# Altium footprint library MyPcbLib.PcbLib: 237 footprints (part 11 of 15)
Each footprint in its own frame and in the unit in brackets; x right, y up, seen from the top. Pads: shape width x height; smd on the part's side, far side on the other; paste and mask are expansions set on the pad; w line width, h text height; cw(c..) or ccw(c..) is an arc to the next point about the centre after c.
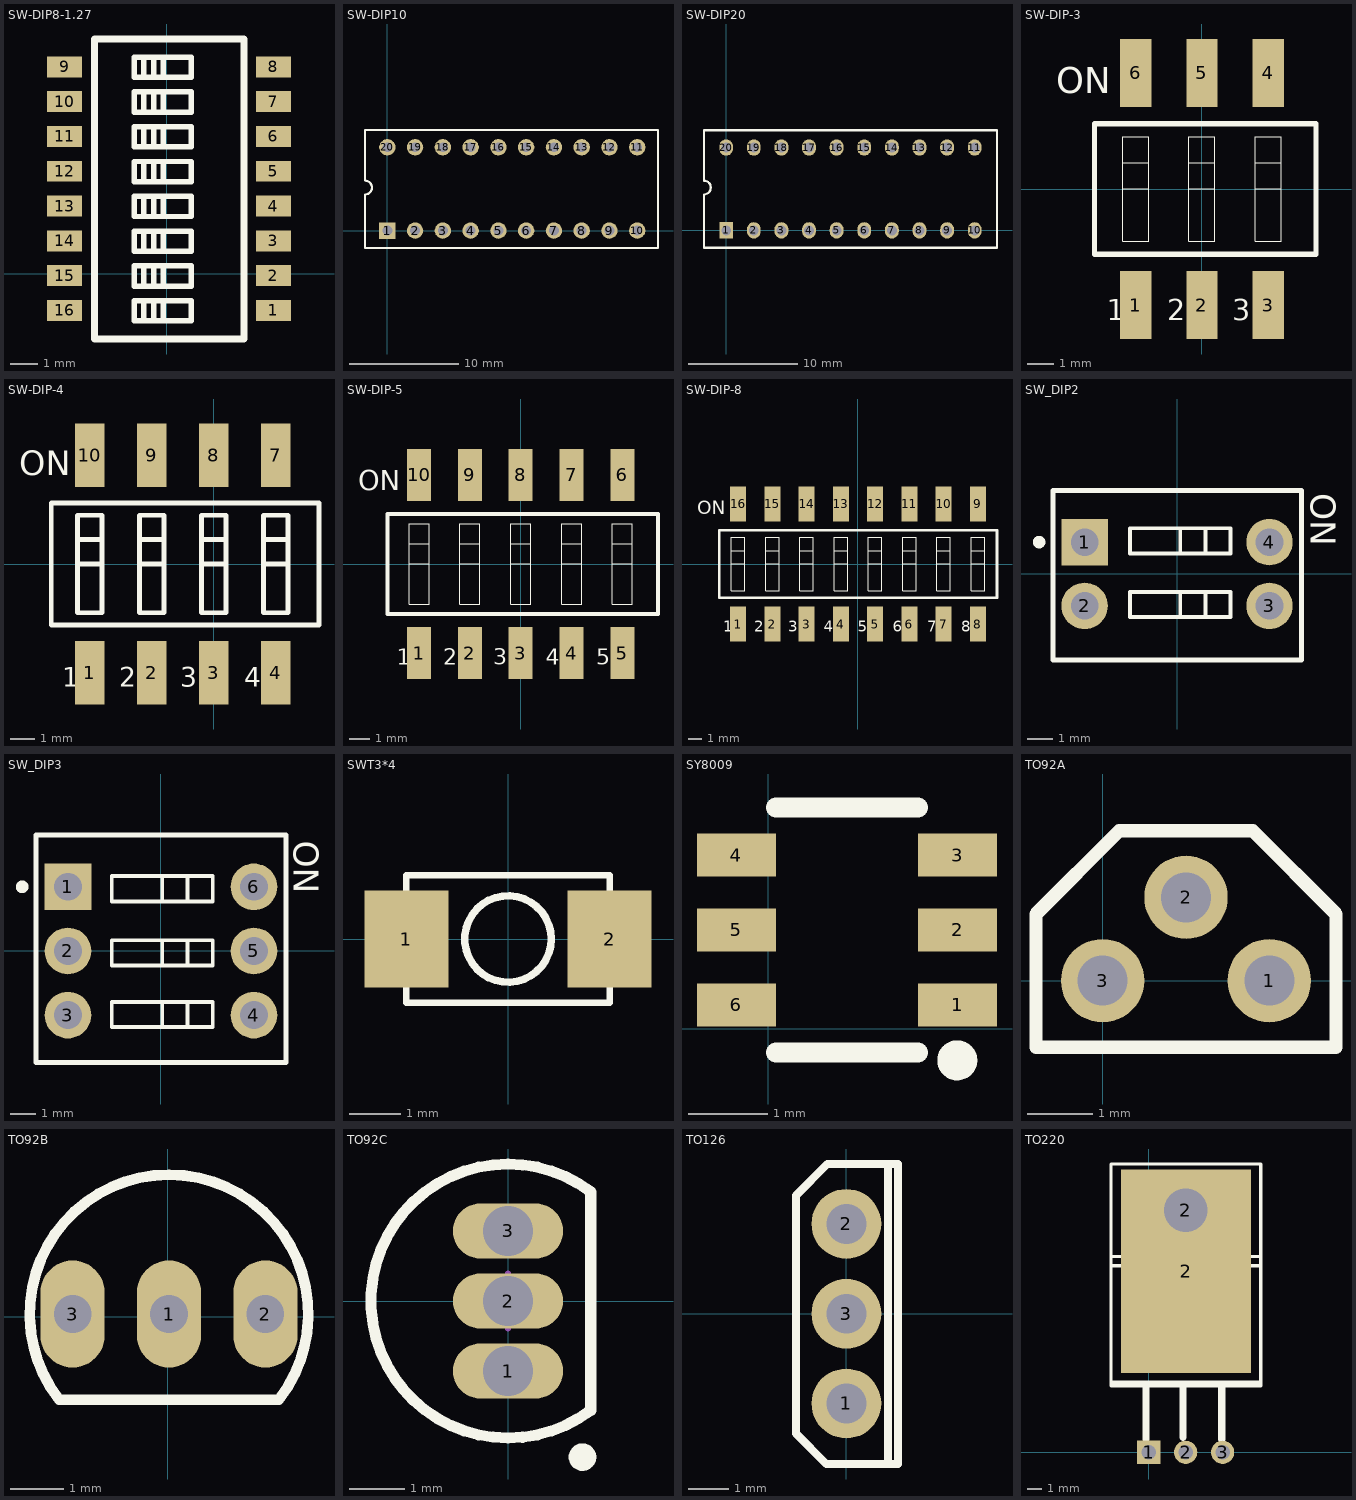
[diagram p10: the footprints below, top view; thin cyan lines are the x and y axes]

## SW-DIP8-1.27 [mil]
pads (16):
  rect 50x29.92 smd: 1(153,-53) 2(153,-3) 3(153,47) 4(153,97) 5(153,147) 6(153,197) 7(153,247) 8(153,297) 9(-147,297) 10(-147,247) 11(-147,197) 12(-147,147) 13(-147,97) 14(-147,47) 15(-147,-3) 16(-147,-53)
Top Overlay:
  lines w7.87: -33,-67 -33,-39 ; -33,-17 -33,11 ; -33,33 -33,61 ; -33,83 -33,111 ; -33,133 -33,161 ; -33,183 -33,211 ; -33,233 -33,261 ; -33,283 -33,311 ; -19,-68 -19,-42 ; -19,-18 -19,8 ; -19,32 -19,58 ; -19,82 -19,108 ; -19,132 -19,158 ; -19,182 -19,208 ; -19,232 -19,258 ; -19,282 -19,308 ; -5,-64 -5,-42 ; -5,-14 -5,8 ; -5,36 -5,58 ; -5,86 -5,108 ; -5,136 -5,158 ; -5,186 -5,208 ; -5,236 -5,258 ; -5,286 -5,308 ; -47,-68 -47,-39 35,-39 35,-68 -47,-68 ; -47,-18 -47,11 35,11 35,-18 -47,-18 ; -47,32 35,32 35,61 -47,61 -47,32 ; -47,82 -47,111 35,111 35,82 -47,82 ; -47,132 35,132 35,161 -47,161 -47,132 ; -47,182 35,182 35,211 -47,211 -47,182 ; -47,232 -47,261 35,261 35,232 -47,232 ; -47,282 35,282 35,311 -47,311 -47,282
  lines w10: -104,106 -104,337 111,337 111,106 ; -104,137 -104,-94 111,-94 111,137
3D body "User Library-Diptronics_DHN4.STEP": height 59.06, standoff 0, extent -135.67,96.79 139,345.21
3D body "User Library-Diptronics_DHN4.STEP": height 59.06, standoff 0, extent -135.67,-103.21 139,145.21

## SW-DIP10 [mm] "DIP; 16 Leads; Row Spacing 7.62 mm; Pitch 2.54 mm"
pads (20):
  rect 1.5x1.5 hole 0.9: 1(0,0)
  round 1.5 hole 0.9: 2(2.54,0) 3(5.08,0) 4(7.62,0) 5(10.16,0) 6(12.7,0) 7(15.24,0) 8(17.78,0) 9(20.32,0) 10(22.86,0) 11(22.86,7.62) 12(20.32,7.62) 13(17.78,7.62) 14(15.24,7.62) 15(12.7,7.62) 16(10.16,7.62) 17(7.62,7.62) 18(5.08,7.62) 19(2.54,7.62) 20(0,7.62)
Top Overlay:
  lines w0.2: -2.05,4.57 cw(c-2.05,3.935) -2.05,3.3 -2.05,-1.59 24.765,-1.59 24.765,9.2 -2.05,9.2 -2.05,4.6
3D body "DIPSWITCH10.STEP": height 6.9, standoff -3.2, extent -2.007,-1.295 24.753,8.865

## SW-DIP20 [mm] "DIP; 16 Leads; Row Spacing 7.62 mm; Pitch 2.54 mm"
pads (20):
  rect 1.27x1.5 hole 0.9: 1(0,0)
  oval 1.27x1.5 hole 0.9: 2(2.54,0) 3(5.08,0) 4(7.62,0) 5(10.16,0) 6(12.7,0) 7(15.24,0) 8(17.78,0) 9(20.32,0) 10(22.86,0) 11(22.86,7.62) 12(20.32,7.62) 13(17.78,7.62) 14(15.24,7.62) 15(12.7,7.62) 16(10.16,7.62) 17(7.62,7.62) 18(5.08,7.62) 19(2.54,7.62) 20(0,7.62)
Top Overlay:
  lines w0.2: -2.05,-1.59 -2.05,3.3 ccw(c-2.05,3.935) -2.05,4.57 ; -2.05,4.6 -2.05,9.2 ; 24.91,-1.59 24.91,9.2
  lines w0.203: -2.05,-1.59 24.892,-1.59 ; -2.05,9.2 24.892,9.2
3D body "User Library-DIP Switch Piano 10X.STEP": height 8.71, standoff -3.99, extent -2.086,-2.639 24.794,8.661

## SW-DIP-3 [mm] "DIP Switch; 16 Leads"
height 5.06
pads (6):
  rect 1.2x2.6 smd: 1(-2.54,-4.45) 2(0,-4.45) 3(2.54,-4.45) 4(2.54,4.45) 5(0,4.45) 6(-2.54,4.45)
Top Overlay:
  lines w0.025: -3.04,0 -2.04,0 ; -3.04,1 -2.04,1 ; -0.5,0 0.5,0 ; -0.5,1 0.5,1 ; 2.04,0 3.04,0 ; 2.04,1 3.04,1 ; -3.04,-2 -3.04,2 -2.04,2 -2.04,-2 -3.04,-2 ; -0.5,-2 -0.5,2 0.5,2 0.5,-2 -0.5,-2 ; 2.04,-2 2.04,2 3.04,2 3.04,-2 2.04,-2
  lines w0.2: -4.115,-2.5 -4.115,2.5 4.369,2.5 4.369,-2.5 -4.115,-2.5
  text "3" at 1.169,-5.032 h0.8
  text "2" at -1.331,-5.032 h0.8
  text "1" at -3.656,-5.032 h0.8
  text "ON" at -5.588,3.678 h1
3D body "DIP3.stp": height 4.4, standoff 0, extent -4.293,-4.951 4.267,4.849

## SW-DIP-4 [mm] "DIP Switch; 16 Leads"
height 5.06
pads (8):
  rect 1.2x2.6 smd: 1(-5.08,-4.45) 2(-2.54,-4.45) 3(0,-4.45) 4(2.54,-4.45) 7(2.54,4.45) 8(0,4.45) 9(-2.54,4.45) 10(-5.08,4.45)
Top Overlay:
  lines w0.2: -5.58,0 -4.58,0 ; -5.58,1 -4.58,1 ; -3.04,0 -2.04,0 ; -3.04,1 -2.04,1 ; -0.5,0 0.5,0 ; -0.5,1 0.5,1 ; 2.04,0 3.04,0 ; 2.04,1 3.04,1 ; -6.655,-2.5 4.318,-2.5 4.318,2.5 -6.655,2.5 -6.655,-2.5 ; -5.58,-2 -4.58,-2 -4.58,2 -5.58,2 -5.58,-2 ; -3.04,-2 -2.04,-2 -2.04,2 -3.04,2 -3.04,-2 ; -0.5,-2 0.5,-2 0.5,2 -0.5,2 -0.5,-2 ; 2.04,-2 3.04,-2 3.04,2 2.04,2 2.04,-2
  text "ON" at -7.976,3.632 h1
  text "1" at -6.196,-5.032 h0.8
  text "2" at -3.871,-5.032 h0.8
  text "3" at -1.371,-5.032 h0.8
  text "4" at 1.254,-5.032 h0.8
3D body "User Library-SMD DIP-4 switch.step": height -0.5, standoff -5.4, extent -6.845,-4.976 4.255,4.824

## SW-DIP-5 [mm] "DIP Switch; 16 Leads"
height 5.06
pads (10):
  rect 1.2x2.6 smd: 1(-5.08,-4.45) 2(-2.54,-4.45) 3(0,-4.45) 4(2.54,-4.45) 5(5.08,-4.45) 6(5.08,4.45) 7(2.54,4.45) 8(0,4.45) 9(-2.54,4.45) 10(-5.08,4.45)
Top Overlay:
  lines w0.025: -5.58,0 -4.58,0 ; -5.58,1 -4.58,1 ; -3.04,0 -2.04,0 ; -3.04,1 -2.04,1 ; -0.5,0 0.5,0 ; -0.5,1 0.5,1 ; 2.04,0 3.04,0 ; 2.04,1 3.04,1 ; 4.58,0 5.58,0 ; 4.58,1 5.58,1 ; -5.58,-2 -4.58,-2 -4.58,2 -5.58,2 -5.58,-2 ; -3.04,-2 -2.04,-2 -2.04,2 -3.04,2 -3.04,-2 ; -0.5,-2 0.5,-2 0.5,2 -0.5,2 -0.5,-2 ; 2.04,-2 3.04,-2 3.04,2 2.04,2 2.04,-2 ; 4.58,-2 5.58,-2 5.58,2 4.58,2 4.58,-2
  lines w0.2: -6.655,-2.5 6.858,-2.5 6.858,2.5 -6.655,2.5 -6.655,-2.5
  text "ON" at -8.128,3.678 h1
  text "1" at -6.196,-5.032 h0.8
  text "2" at -3.871,-5.032 h0.8
  text "3" at -1.371,-5.032 h0.8
  text "4" at 1.254,-5.032 h0.8
  text "5" at 3.779,-5.032 h0.8
3D body "DIP5.stp": height 4.4, standoff 0, extent -6.795,-5.105 6.845,4.695

## SW-DIP-8 [mm] "DIP Switch; 16 Leads"
height 5.06
pads (16):
  rect 1.2x2.6 smd: 1(-8.89,-4.45) 2(-6.35,-4.45) 3(-3.81,-4.45) 4(-1.27,-4.45) 5(1.27,-4.45) 6(3.81,-4.45) 7(6.35,-4.45) 8(8.89,-4.45) 9(8.89,4.45) 10(6.35,4.45) 11(3.81,4.45) 12(1.27,4.45) 13(-1.27,4.45) 14(-3.81,4.45) 15(-6.35,4.45) 16(-8.89,4.45)
Top Overlay:
  lines w0.025: -9.39,0 -8.39,0 ; -9.39,1 -8.39,1 ; -6.85,0 -5.85,0 ; -6.85,1 -5.85,1 ; -4.31,0 -3.31,0 ; -4.31,1 -3.31,1 ; -1.77,0 -0.77,0 ; -1.77,1 -0.77,1 ; 0.77,0 1.77,0 ; 0.77,1 1.77,1 ; 3.31,0 4.31,0 ; 3.31,1 4.31,1 ; 5.85,0 6.85,0 ; 5.85,1 6.85,1 ; 8.39,0 9.39,0 ; 8.39,1 9.39,1 ; -9.39,-2 -9.39,2 -8.39,2 -8.39,-2 -9.39,-2 ; -6.85,-2 -6.85,2 -5.85,2 -5.85,-2 -6.85,-2 ; -4.31,-2 -4.31,2 -3.31,2 -3.31,-2 -4.31,-2 ; -1.77,-2 -1.77,2 -0.77,2 -0.77,-2 -1.77,-2 ; 0.77,-2 0.77,2 1.77,2 1.77,-2 0.77,-2 ; 3.31,-2 3.31,2 4.31,2 4.31,-2 3.31,-2 ; 5.85,-2 5.85,2 6.85,2 6.85,-2 5.85,-2 ; 8.39,-2 8.39,2 9.39,2 9.39,-2 8.39,-2
  lines w0.2: -10.29,-2.5 -10.29,2.5 10.31,2.5 10.31,-2.5 -10.29,-2.5
  text "6" at 2.569,-5.032 h0.8
  text "5" at -0.031,-5.032 h0.8
  text "4" at -2.556,-5.032 h0.8
  text "3" at -5.181,-5.032 h0.8
  text "2" at -7.681,-5.032 h0.8
  text "1" at -10.006,-5.032 h0.8
  text "ON" at -11.938,3.678 h1
  text "7" at 5.119,-5.032 h0.8
  text "8" at 7.659,-5.032 h0.8
3D body "SW3dPS-219-8MST.STEP": height 4.3, standoff 0.05, extent -10.182,-4.83 10.182,5.08

## SW_DIP2 [mm] "DIP Switch; 16 Leads"
height 5.06
pads (4):
  rect 1.85x1.85 hole 1.1: 1(-3.683,1.27)
  round 1.85 hole 1.1: 2(-3.683,-1.27) 3(3.683,-1.27) 4(3.683,1.27)
Top Overlay:
  circle w0.25: c-5.496,1.271 r0.125
  lines w0.152: 0.127,-1.719 0.127,-0.719 ; 0.127,0.821 0.127,1.821 ; 1.127,-1.719 1.127,-0.719 ; 1.127,0.821 1.127,1.821 ; -1.873,-1.719 2.127,-1.719 2.127,-0.719 -1.873,-0.719 -1.873,-1.719 ; -1.873,0.821 2.127,0.821 2.127,1.821 -1.873,1.821 -1.873,0.821
  lines w0.2: -4.94,-3.429 -4.94,3.327 4.953,3.327 4.953,-3.429 -4.94,-3.429
  text "ON" at 5.334,3.226 h1
3D body "19619.stp": height 10.3, standoff 0, extent -5.001,-3.396 4.899,3.244

## SW_DIP3 [mm] "Switch; 6 Leads"
pads (6):
  rect 1.85x1.85 hole 1.1: 1(-3.683,2.54)
  round 1.85 hole 1.1: 2(-3.683,0) 3(-3.683,-2.54) 4(3.683,-2.54) 5(3.683,0) 6(3.683,2.54)
Top Overlay:
  circle w0.25: c-5.496,2.541 r0.125
  lines w0.152: 0.051,-3.015 0.051,-2.015 ; 0.051,-0.576 0.051,0.424 ; 0.051,1.964 0.051,2.964 ; 1.051,-3.015 1.051,-2.015 ; 1.051,-0.576 1.051,0.424 ; 1.051,1.964 1.051,2.964 ; -1.949,-3.015 -1.949,-2.015 2.051,-2.015 2.051,-3.015 -1.949,-3.015 ; -1.949,-0.576 2.051,-0.576 2.051,0.424 -1.949,0.424 -1.949,-0.576 ; -1.949,1.964 2.051,1.964 2.051,2.964 -1.949,2.964 -1.949,1.964
  lines w0.2: -4.94,-4.42 4.953,-4.42 4.953,4.597 -4.94,4.597 -4.94,-4.42
  text "ON" at 5.258,4.369 h1
3D body "19620.stp": height 6.15, standoff -3.05, extent -4.975,-4.539 4.925,4.641

## SWT3*4 [mm]
pads (2):
  rect 1.65x1.9 smd: 1(-2,0) 2(2,0)
Top Overlay:
  circle w0.15: c0,0 r0.85
  lines w0.127: -2,-1.25 2,-1.25 2,1.25 -2,1.25 -2,-1.25
3D body "KEY-SMD3x4.STEP": height 2, standoff 0, extent -2.45,-1.452 2.45,1.448

## SY8009 [mm]
pads (6):
  rect 1x0.55 smd: 1(2.4,0.3) 2(2.4,1.25) 3(2.4,2.2) 4(-0.4,2.2) 5(-0.4,1.25) 6(-0.4,0.3)
Top Overlay:
  circle w0.254: c2.397,-0.401 r0.127
  lines w0.254: 0.1,-0.3 1.9,-0.3 ; 0.1,2.8 1.9,2.8
Mechanical 15:
  circle w0.2: c2.4,0.3 r0.1

## TO92A [mil] "7805/7809/LP2950电源芯片（未加焊）"
pads (3):
  round 50 hole 30: 1(100,0) 2(50,50) 3(0,0)
Top Overlay:
  lines w8: -40,-40 140,-40 140,40 90,90 10,90 -40,40 -40,-40
3D body "micromsd_n.stp": height 269.29, standoff -118.11, extent -39.17,-37.8 138.78,96.06

## TO92B [mm] "TO, Flat Index; 3 In-Line, Axial Leads; Body Dia. 4.8mm; Leads 0.48 x 0.5 mm (max)"
height 5.33
pads (3):
  oval 1.2x2 hole 0.7: 1(0.025,0.051) 2(1.825,0.051) 3(-1.775,0.051)
Top Overlay:
  lines w0.2: -2.023,-1.55 cw(c0.025,0.051) 2.074,-1.55 ; -1.965,-1.549 2.015,-1.549
3D body "TO-92S.STEP": height 6.1, standoff -4.5, extent -2.271,-1.21 2.321,2.347

## TO92C [mm] "TO, Flat Index; 3 In-Line, Axial Leads; Body Dia. 4.5mm; Leads 0.51 x 0.48 mm (max)"
height 6.86
pads (3):
  oval 2x1 hole 0.9: 1(0,-1.27) 2(0,0) 3(0,1.27)
Top Overlay:
  circle w0.25: c1.35,-2.83 r0.125
  lines w0.2: 1.5,-1.981 1.5,1.956 ; 1.5,-1.98 cw(c0,0) 1.5,1.98
Mechanical 13:
  lines w0.1: 1.5,-1.98 1.5,1.98
Mechanical 15:
  lines w0.1: -0.5,0 0.5,0 ; 0,-0.5 0,0.5
3D body "TO-92-2.STEP": height 8.09, standoff -6.11, extent -2.318,-2.45 1.682,2.349

## TO126 [mm] "BD135"
pads (3):
  round 1.75 hole 1: 1(0,-2.25) 2(0,2.25) 3(0,0)
Top Overlay:
  lines w0.2: 1.041,-3.734 1.041,3.734 ; -1.268,-3.005 -0.506,-3.767 1.295,-3.767 1.295,3.752 -0.48,3.752 -1.268,2.964 -1.268,-3.005
3D body "BD135 (TO-126 SOT32) v4.step": height 14.6, standoff -3.35, extent -1.797,-3.934 0.903,3.866

## TO220 [mm]
pads (5):
  rect 1.6x1.6 hole 1: 1(0,0)
  round 1.6 hole 1: 2(2.54,0) 3(5.08,0)
  round 4 hole 3: 2(2.54,16.637)
  rect 8.9x14 smd: 2(2.565,12.446)
Top Overlay:
  lines w0.22: -2.591,4.699 7.696,4.699 ; -2.591,4.826 7.696,4.826 ; -2.591,12.827 7.696,12.827 ; -2.591,13.462 7.696,13.462 ; -2.591,19.05 -2.591,19.812 7.696,19.812 7.696,4.572 -2.591,4.572 -2.591,19.558
  lines w0.5: -0.178,0.889 -0.178,4.572 ; 2.362,1.016 2.362,4.699 ; 5.029,0.889 5.029,4.572
3D body "User Library-TO220 L.STEP": height 4.5, standoff -3, extent -2.638,-0.127 7.362,19.577